# Altium footprint library USBes.PcbLib: 65 footprints (part 5 of 5)
Each footprint in its own frame and in the unit in brackets; x right, y up, seen from the top. Pads: shape width x height; smd on the part's side, far side on the other; paste and mask are expansions set on the pad; w line width, h text height; cw(c..) or ccw(c..) is an arc to the next point about the centre after c.
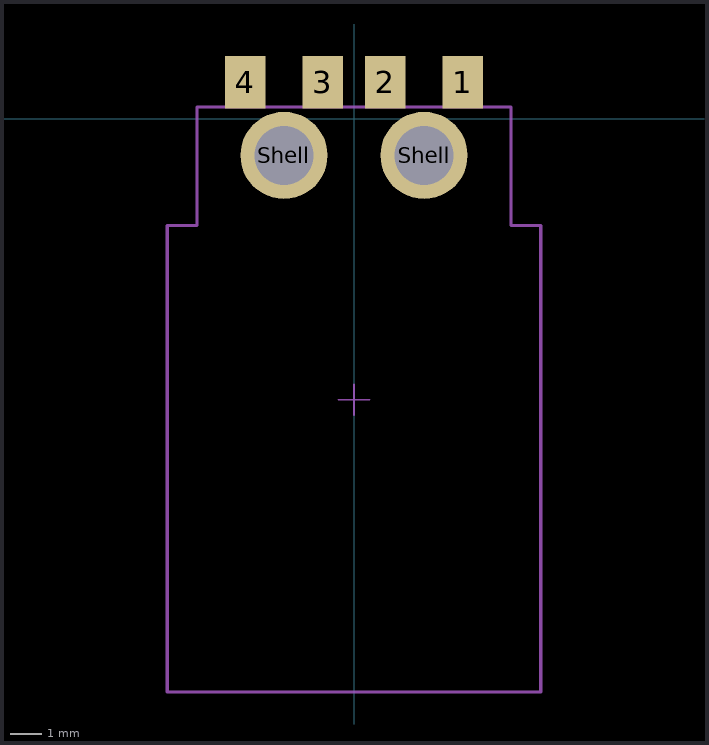
[diagram p4: the footprint, top view; thin cyan lines are the x and y axes]

##  [mm] "USB 2.0 Plug Type A SMT with Clip"
height 19.8
pads (6):
  rect 1.3x1.7 smd: 1(3.5,1.175) 2(1,1.175) 3(-1,1.175) 4(-3.5,1.175)
  round 2.8 hole 1.9: Shell(-2.25,-1.175) Shell(2.25,-1.175)
Mechanical 13:
  lines w0.1: -4.05,0.375 -4.05,1.375 -2.95,1.375 -2.95,0.375 ; -1.55,0.375 -1.55,1.375 -0.45,1.375 -0.45,0.375 ; 0.45,0.375 0.45,1.375 1.55,1.375 1.55,0.375 ; 2.95,0.375 2.95,1.375 4.05,1.375 4.05,0.375 ; -6,-18.425 6,-18.425 6,-3.425 5.05,-3.425 5.05,0.375 -5.05,0.375 -5.05,-3.425 -6,-3.425 -6,-18.425
Mechanical 15:
  lines w0.05: -0.5,-9.025 0.5,-9.025 ; 0,-9.525 0,-8.525
3D body "629004113921.stp": height 2.25, standoff -2.25, extent -6,-18.425 6,1.375